# Altium footprint library 3D_MIG_Controller.PCBLIB: 560 footprints (part 22 of 35)
Each footprint in its own frame and in the unit in brackets; x right, y up, seen from the top. Pads: shape width x height; smd on the part's side, far side on the other; paste and mask are expansions set on the pad; w line width, h text height; cw(c..) or ccw(c..) is an arc to the next point about the centre after c.
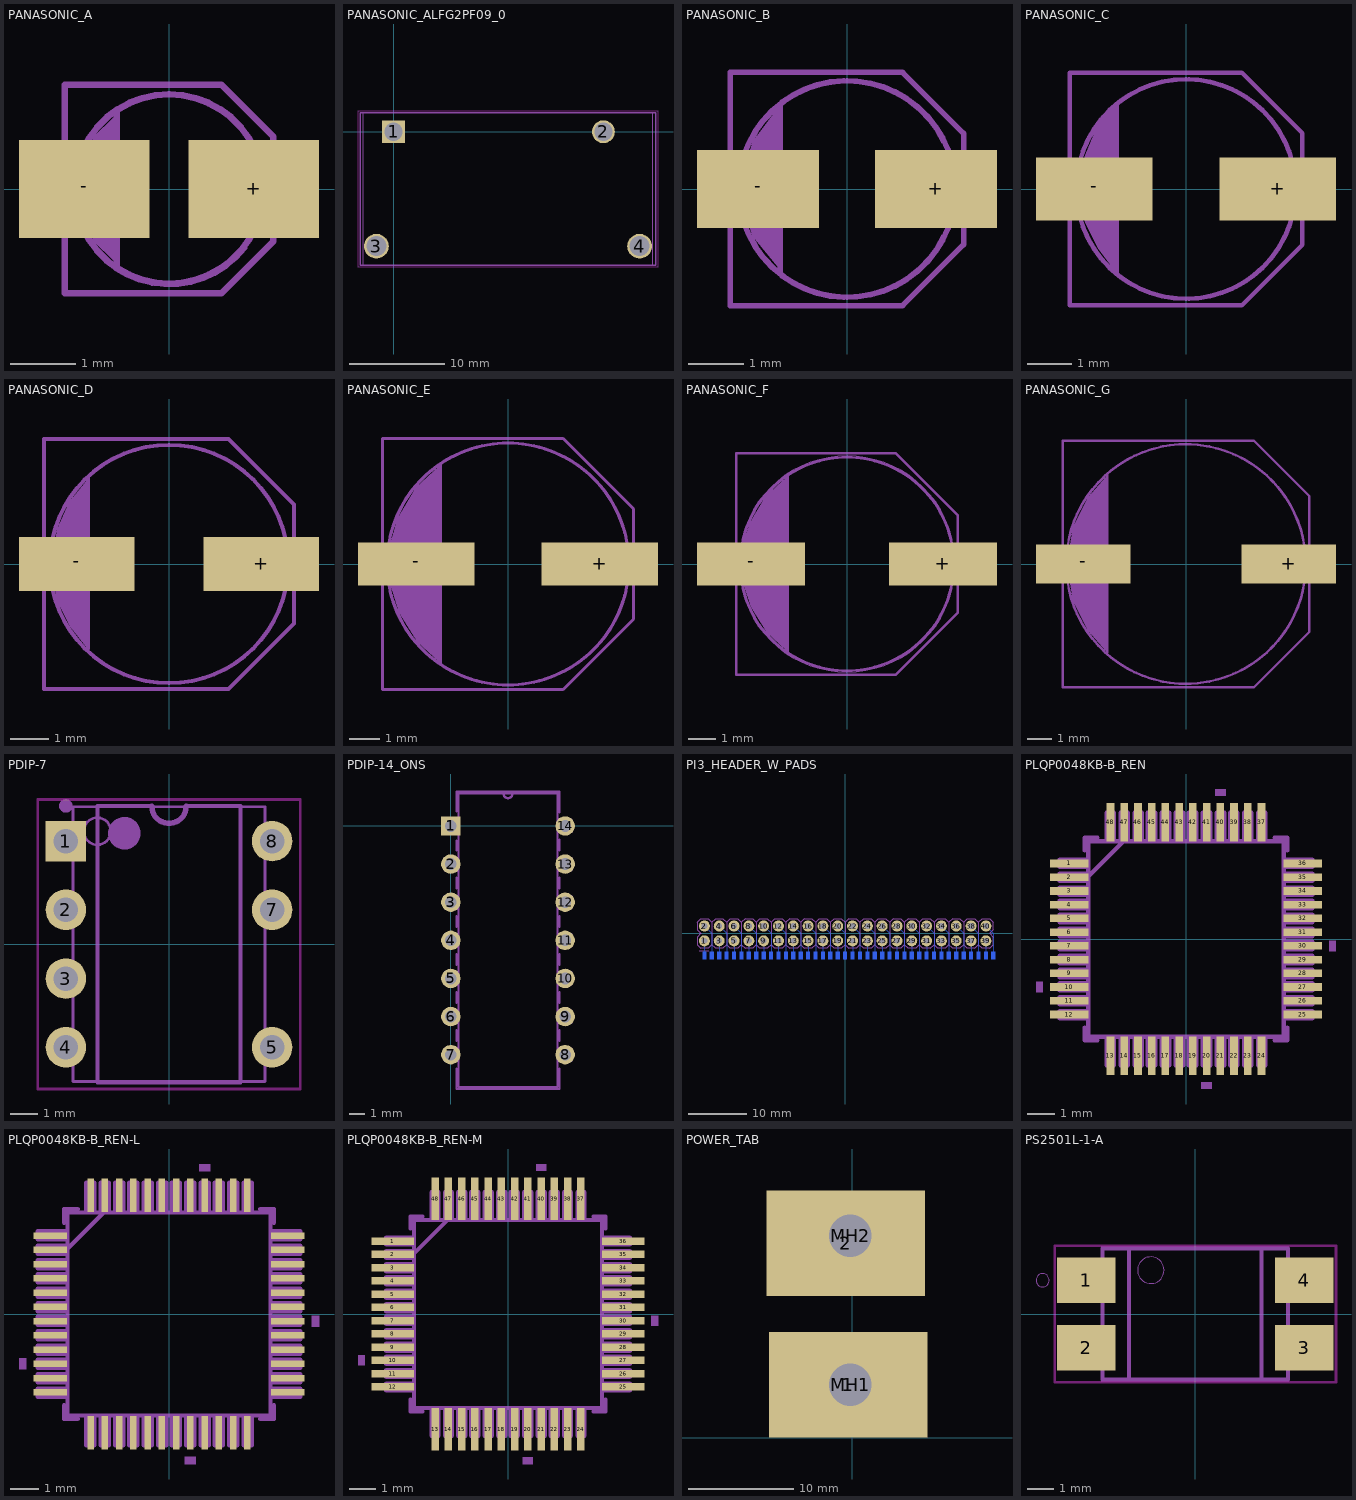
[diagram p21: the footprints below, top view; thin cyan lines are the x and y axes]

## PANASONIC_A [mm]
pads (2):
  rect 2x1.5 smd: +(1.3,0) -(-1.3,0)
tDocu:
  circle w0.102: c0,0 r1.45
  region: -1.8,-0.3 -1.8,0.3 -1.45,0.3 -1.45,-0.3
  region: 1.45,-0.3 1.45,0.3 1.8,0.3 1.8,-0.3
  region: -0.85,1.1 -1.15,0.8 -1.35,0.3 -1.35,-0.3 -1.15,-0.8 -0.85,-1.1 -0.85,1.05
  lines w0.102: -0.8,-1.2 -0.8,1.2 ; -1.6,-1.6 0.8,-1.6 1.6,-0.8 1.6,0.8 0.8,1.6 -1.6,1.6 -1.6,-1.6
tPlace:
  lines w0.102: -1.6,-0.95 -1.6,-1.6 0.8,-1.6 1.5,-0.9 ; -1.6,0.95 -1.6,1.6 0.8,1.6 1.5,0.9 ; -1.1,-0.95 ccw(c0.004,0) 1.15,-0.9 ; -1.1,0.95 cw(c0,0) 1.1,0.95

## PANASONIC_ALFG2PF09_0 [mil]
pads (4):
  rect 94.49x94.49 / inner round 87.3 / far side rect 94.49x94.49 hole 74.8: 1(0,0)
  round 94.49 hole 74.8: 2(866.14,0)
  round 102.36 hole 82.68: 3(-70.87,-472.44) 4(1015.75,-472.44)
Top keep-out:
  lines w3.94: -146.65,-560.04 -146.65,87.6 1091.54,87.6 1091.54,-560.04 -146.65,-560.04
tDocu:
  lines w3.94: -125.98,-551.18 1070.87,-551.18 1070.87,78.74 -125.98,78.74 -125.98,-551.18
tPlace:
  lines w5.91: -137.8,-551.18 -137.8,78.74 1082.68,78.74 1082.68,-551.18 -137.8,-551.18

## PANASONIC_B [mil]
pads (2):
  rect 86.61x55.12 smd: +(62.99,0) -(-62.99,0)
tDocu:
  circle w4: c0,0 r76.77
  region: -90.55,-13.78 -90.55,13.78 -72.83,13.78 -72.83,-13.78
  region: 74.8,-13.78 74.8,13.78 90.55,13.78 90.55,-13.78
  region: -49.21,57.09 -66.93,33.46 -72.83,13.78 -72.83,-15.75 -66.93,-33.46 -49.21,-55.12 -49.21,55.12
  lines w4: -47.24,-59.06 -47.24,59.06 ; -82.68,-82.68 39.37,-82.68 82.68,-39.37 82.68,39.37 39.37,82.68 -82.68,82.68 -82.68,-82.68
tPlace:
  lines w4: -82.68,-33.46 -82.68,-82.68 39.37,-82.68 82.68,-39.37 ; -82.68,33.46 -82.68,82.68 39.37,82.68 82.68,39.37 ; -68.9,-33.46 ccw(c0,0.01) 68.9,-33.46 ; -68.9,33.46 cw(c0,-0.01) 68.9,33.46

## PANASONIC_C [mil]
pads (2):
  rect 102.36x55.12 smd: +(80.71,0) -(-80.71,0)
tDocu:
  circle w4: c0,0 r96.46
  region: -116.14,-13.78 -116.14,13.78 -94.49,13.78 -94.49,-13.78
  region: 94.49,-13.78 94.49,13.78 116.14,13.78 116.14,-13.78
  region: -62.99,70.87 -78.74,53.15 -88.58,29.53 -96.46,1.97 -88.58,-29.53 -76.77,-53.15 -62.99,-70.87
  lines w4: -61.02,-72.83 -61.02,72.83 ; -102.36,-102.36 49.21,-102.36 102.36,-49.21 102.36,49.21 49.21,102.36 -102.36,102.36 -102.36,-102.36
tPlace:
  lines w4: -102.36,-37.4 -102.36,-102.36 49.21,-102.36 102.36,-49.21 102.36,-37.4 ; -102.36,37.4 -102.36,102.36 49.21,102.36 102.36,49.21 102.36,37.4 ; -90.55,-33.46 ccw(c0,0) 90.55,-33.46 ; -90.55,33.46 cw(c0,0) 90.55,33.46

## PANASONIC_D [mm]
pads (2):
  rect 3x1.4 smd: +(2.4,0) -(-2.4,0)
tDocu:
  circle w0.102: c0,0 r3.1
  region: -3.65,-0.35 -3.65,0.35 -3.05,0.35 -3.05,-0.35
  region: 3.05,-0.35 3.05,0.35 3.65,0.35 3.65,-0.35
  region: -2.15,2.15 -2.6,1.6 -2.9,0.9 -3.05,0 -2.9,-0.95 -2.55,-1.65 -2.15,-2.15 -2.15,2.1
  lines w0.102: -2.1,-2.2 -2.1,2.25 ; -3.25,-3.25 1.55,-3.25 3.25,-1.55 3.25,1.55 1.55,3.25 -3.25,3.25 -3.25,-3.25
tPlace:
  lines w0.102: -3.25,-0.95 -3.25,-3.25 1.55,-3.25 3.25,-1.55 3.25,-0.95 ; -3.25,0.95 -3.25,3.25 1.55,3.25 3.25,1.55 3.25,0.95 ; -2.95,-0.95 ccw(c0,0) 2.95,-0.95 ; -2.95,0.95 cw(c0,0) 2.95,0.95

## PANASONIC_E [mm]
pads (2):
  rect 3.8x1.4 smd: +(3,0) -(-3,0)
tDocu:
  circle w0.102: c0,0 r3.95
  region: -4.5,-0.35 -4.5,0.35 -3.8,0.35 -3.8,-0.35
  region: 3.8,-0.35 3.8,0.35 4.5,0.35 4.5,-0.35
  region: -2.25,3.2 -3,2.5 -3.6,1.5 -3.85,0.65 -3.85,-0.65 -3.55,-1.6 -2.95,-2.55 -2.25,-3.2 -2.25,3.15
  lines w0.102: -2.2,-3.25 -2.2,3.25 ; -4.1,-4.1 1.8,-4.1 4.1,-1.8 4.1,1.8 1.8,4.1 -4.1,4.1 -4.1,-4.1
tPlace:
  lines w0.102: -4.1,-0.9 -4.1,-4.1 1.8,-4.1 4.1,-1.8 4.1,-0.9 ; -4.1,0.9 -4.1,4.1 1.8,4.1 4.1,1.8 4.1,0.9 ; -3.85,-0.9 ccw(c0,0) 3.85,-0.9 ; -3.85,0.9 cw(c0,0) 3.85,0.9

## PANASONIC_F [mm]
pads (2):
  rect 4x1.6 smd: +(3.55,0) -(-3.55,0)
tDocu:
  circle w0.001: c0,0 r4
  circle w0.102: c0,0 r3.95
  region: -4.85,-0.45 -4.85,0.45 -3.9,0.45 -3.9,-0.45
  region: 3.9,-0.45 3.9,0.45 4.85,0.45 4.85,-0.45
  region: -2.25,3.2 -3,2.5 -3.6,1.5 -3.85,0.65 -3.85,-0.65 -3.55,-1.6 -2.95,-2.55 -2.25,-3.2 -2.25,3.15
  lines w0.102: -2.2,-3.25 -2.2,3.25 ; -4.1,-4.1 1.8,-4.1 4.1,-1.8 4.1,1.8 1.8,4.1 -4.1,4.1 -4.1,-4.1
tPlace:
  lines w0.102: -4.1,-1 -4.1,-4.1 1.8,-4.1 4.1,-1.8 4.1,-1 ; -4.1,1 -4.1,4.1 1.8,4.1 4.1,1.8 4.1,1 ; -3.85,-0.9 ccw(c0,0) 3.85,-0.9 ; -3.85,0.9 cw(c0,0) 3.85,0.9

## PANASONIC_G [mil]
pads (2):
  rect 153.54x62.99 smd: +(167.32,0) -(-167.32,0)
tDocu:
  circle w4: c0,0 r194.88
  region: -230.32,-17.72 -230.32,17.72 -192.91,17.72 -192.91,-17.72
  region: 192.91,-17.72 192.91,17.72 230.32,17.72 230.32,-17.72
  region: -129.92,141.73 -159.45,108.27 -183.07,61.02 -190.94,17.72 -190.94,-17.72 -183.07,-61.02 -159.45,-108.27 -129.92,-141.73 -129.92,139.76
  lines w4: -127.95,-143.7 -127.95,145.67 ; -200.79,-200.79 110.24,-200.79 200.79,-110.24 200.79,110.24 110.24,200.79 -200.79,200.79 -200.79,-200.79
tPlace:
  lines w4: -200.79,-39.37 -200.79,-200.79 110.24,-200.79 200.79,-110.24 200.79,-39.37 ; -200.79,39.37 -200.79,200.79 110.24,200.79 200.79,110.24 200.79,39.37 ; -190.94,-39.37 ccw(c0,0) 190.94,-39.37 ; -190.94,39.37 cw(c0,0) 190.94,39.37

## PDIP-7 [mil]
pads (7):
  rect 59.06x59.06 / inner round 54.56 / far side rect 59.06x59.06 hole 35.43: 1(-150,150)
  round 59.06 hole 35.43: 2(-150,50) 3(-150,-50) 4(-150,-150) 5(150,-150) 7(150,50) 8(150,150)
Top keep-out:
  lines w3.94: -190.94,-210.63 -190.94,210.63 190.94,210.63 190.94,-210.63 -190.94,-210.63
tDocu:
  circle w3.94: c-104.33,164.37 r19.69
  lines w3.94: -139.76,-199.8 -139.76,199.8 139.76,199.8 139.76,-199.8 -139.76,-199.8
tPlace:
  circle w9.84: c-150,201.18 r4.92
  circle w23.62: c-64.96,161.42 r11.81
  lines w5.91: -25,200.79 -104.33,200.79 -104.33,-200.79 104.33,-200.79 104.33,200.79 25,200.79
  lines w7.87: -25,200.79 ccw(c0,200.79) 25,200.79

## PDIP-14_ONS [mil]
pads (14):
  rect 51x51 / inner round 47.12 / far side rect 51x51 hole 31: 1(0,0)
  round 51 hole 31: 2(0,-100) 3(0,-200) 4(0,-300) 5(0,-400) 6(0,-500) 7(0,-600) 8(300,-600) 9(300,-500) 10(300,-400) 11(300,-300) 12(300,-200) 13(300,-100) 14(300,0)
tDocu:
  lines w6: 138,85 162,85 ; 138,85 20,85 20,-685 280,-685 280,85 162,85 ; 138,85 ccw(c150,85) 162,85 ; -16,-184 20,-184 20,-216 -15,-216 -16,-184 ; -16,-85 20,-84 20,-116 -15,-116 -16,-85 ; -16,15 20,16 20,-16 -15,-16 -16,15 ; -15,-616 -15,-584 20,-584 20,-616 -15,-616 ; -15,-516 -15,-484 20,-484 20,-516 -15,-516 ; -15,-416 -15,-384 20,-384 20,-416 -15,-416 ; -15,-316 -15,-284 20,-284 20,-316 -15,-316 ; 280,-616 280,-584 316,-584 316,-616 280,-616 ; 280,-516 280,-484 316,-484 316,-516 280,-516 ; 280,-416 280,-384 316,-384 316,-416 280,-416 ; 280,-316 280,-284 316,-284 316,-316 280,-316 ; 280,-216 280,-184 316,-184 316,-216 280,-216 ; 280,-116 280,-84 316,-84 316,-116 280,-116 ; 280,-16 280,16 316,16 316,-15 280,-16
  text "*" at 7,-25 h77.5
tPlace:
  lines w6: 15,-636 15,-690 285,-690 285,-636 ; 15,-564 15,-536 ; 15,-464 15,-436 ; 15,-364 15,-336 ; 15,-264 15,-236 ; 15,-164 15,-136 ; 15,-64 15,-39 ; 15,39 15,90 285,90 285,36 ; 285,-564 285,-536 ; 285,-464 285,-436 ; 285,-364 285,-336 ; 285,-264 285,-236 ; 285,-164 285,-136 ; 285,-64 285,-36
  text "*" at -23,30 h77.5

## PI3_HEADER_W_PADS [mil]
pads (80):
  round 74 hole 39.37: 1(-950,-50) 2(-950,50) 3(-850,-50) 4(-850,50) 5(-750,-50) 6(-750,50) 7(-650,-50) 8(-650,50) 9(-550,-50) 10(-550,50) 11(-450,-50) 12(-450,50) 13(-350,-50) 14(-350,50) 15(-250,-50) 16(-250,50) 17(-150,-50) 18(-150,50) 19(-50,-50) 20(-50,50) 21(50,-50) 22(50,50) 23(150,-50) 24(150,50) 25(250,-50) 26(250,50) 27(350,-50) 28(350,50) 29(450,-50) 30(450,50) 31(550,-50) 32(550,50) 33(650,-50) 34(650,50) 35(750,-50) 36(750,50) 37(850,-50) 38(850,50) 39(950,-50) 40(950,50)
  rect 25x50 smd far side: P$1(-950,-150) P$2(-900,-150) P$3(-850,-150) P$4(-800,-150) P$5(-750,-150) P$6(-700,-150) P$7(-650,-150) P$8(-600,-150) P$9(-550,-150) P$10(-500,-150) P$11(-450,-150) P$12(-400,-150) P$13(-350,-150) P$14(-300,-150) P$15(-250,-150) P$16(-200,-150) P$17(-150,-150) P$18(-100,-150) P$19(-50,-150) P$20(0,-150) P$21(50,-150) P$22(100,-150) P$23(150,-150) P$24(200,-150) P$25(250,-150) P$26(300,-150) P$27(350,-150) P$28(400,-150) P$29(450,-150) P$30(500,-150) P$31(550,-150) P$32(600,-150) P$33(650,-150) P$34(700,-150) P$35(750,-150) P$36(800,-150) P$37(850,-150) P$38(900,-150) P$39(950,-150) P$40(1000,-150)
Bottom:
  lines w7.87: -950,-150 -950,-50 ; -950,50 -900,0 -900,-150 ; -850,-150 -850,-50 ; -850,50 -800,0 -800,-150 ; -750,-150 -750,-50 ; -750,50 -700,0 -700,-150 ; -650,-150 -650,-50 ; -650,50 -600,0 -600,-150 ; -550,-150 -550,-50 ; -550,50 -500,0 -500,-150 ; -450,-150 -450,-50 ; -450,50 -400,0 -400,-150 ; -350,-150 -350,-50 ; -350,50 -300,0 -300,-150 ; -250,-150 -250,-50 ; -250,50 -200,0 -200,-150 ; -150,-150 -150,-50 ; -150,50 -100,0 -100,-150 ; -50,-150 -50,-50 ; -50,50 0,0 0,-150 ; 50,-150 50,-50 ; 50,50 100,0 100,-150 ; 150,-150 150,-50 ; 150,50 200,0 200,-150 ; 250,-150 250,-50 ; 250,50 300,0 300,-150 ; 350,-150 350,-50 ; 350,50 400,0 400,-150 ; 450,-150 450,-50 ; 450,50 500,0 500,-150 ; 550,-150 550,-50 ; 550,50 600,0 600,-150 ; 650,-150 650,-50 ; 650,50 700,0 700,-150 ; 750,-150 750,-50 ; 750,50 800,0 800,-150 ; 850,-150 850,-50 ; 850,50 900,0 900,-150 ; 950,-150 950,-50 ; 950,50 1000,0 1000,-150
tDocu:
  drawing of 40 lines, arcs and shapes, not listed
tPlace:
  lines w8: -984.88,-115.37 -919.88,-115.37 ; -899.88,-75.37 -924.88,-100.37 -974.88,-100.37 -999.88,-75.37 -999.88,-25.37 -974.88,-0.37 -999.88,24.63 -999.88,74.63 -974.88,99.63 -924.88,99.63 -899.88,74.63 ; -899.88,-75.37 -874.88,-100.37 -824.88,-100.37 -799.88,-75.37 ; -899.88,-75.37 -899.88,74.63 ; -899.88,74.63 -874.88,99.63 -824.88,99.63 -799.88,74.63 ; -799.88,-75.37 -774.88,-100.37 -724.88,-100.37 -699.88,-75.37 ; -799.88,-75.37 -799.88,74.63 ; -799.88,74.63 -774.88,99.63 -724.88,99.63 -699.88,74.63 ; -699.88,-75.37 -674.88,-100.37 -624.88,-100.37 -599.88,-75.37 ; -699.88,-75.37 -699.88,74.63 ; -699.88,74.63 -674.88,99.63 -624.88,99.63 -599.88,74.63 ; -599.88,-75.37 -574.88,-100.37 -524.88,-100.37 -499.88,-75.37 ; -599.88,-75.37 -599.88,74.63 ; -599.88,74.63 -574.88,99.63 -524.88,99.63 -499.88,74.63 ; -499.88,-75.37 -474.88,-100.37 -424.88,-100.37 -399.88,-75.37 ; -499.88,-75.37 -499.88,74.63 ; -499.88,74.63 -474.88,99.63 -424.88,99.63 -399.88,74.63 ; -399.88,-75.37 -374.88,-100.37 -324.88,-100.37 -299.88,-75.37 ; -399.88,-75.37 -399.88,74.63 ; -399.88,74.63 -374.88,99.63 -324.88,99.63 -299.88,74.63 ; -299.88,-75.37 -274.88,-100.37 -224.88,-100.37 -199.88,-75.37 ; -299.88,-75.37 -299.88,74.63 ; -299.88,74.63 -274.88,99.63 -224.88,99.63 -199.88,74.63 ; -199.88,-75.37 -174.88,-100.37 -124.88,-100.37 -99.88,-75.37 ; -199.88,-75.37 -199.88,74.63 ; -199.88,74.63 -174.88,99.63 -124.88,99.63 -99.88,74.63 ; -99.88,-75.37 -74.88,-100.37 -24.88,-100.37 0.12,-75.37 ; -99.88,-75.37 -99.88,74.63 ; -99.88,74.63 -74.88,99.63 -24.88,99.63 0.12,74.63 ; 0.12,-75.37 25.12,-100.37 75.12,-100.37 100.12,-75.37 ; 0.12,-75.37 0.12,74.63 ; 0.12,74.63 25.12,99.63 75.12,99.63 100.12,74.63 ; 100.12,-75.37 125.12,-100.37 175.12,-100.37 200.12,-75.37 ; 100.12,-75.37 100.12,74.63 ; 100.12,74.63 125.12,99.63 175.12,99.63 200.12,74.63 ; 200.12,-75.37 225.12,-100.37 275.12,-100.37 300.12,-75.37 ; 200.12,-75.37 200.12,74.63 ; 200.12,74.63 225.12,99.63 275.12,99.63 300.12,74.63 ; 300.12,-75.37 300.12,74.63 ; 300.12,-75.37 325.12,-100.37 375.12,-100.37 400.12,-75.37 ; 300.12,74.63 325.12,99.63 375.12,99.63 400.12,74.63 ; 400.12,-75.37 400.12,74.63 ; 400.12,-75.37 425.12,-100.37 475.12,-100.37 500.12,-75.37 ; 400.12,74.63 425.12,99.63 475.12,99.63 500.12,74.63 ; 500.12,-75.37 500.12,74.63 ; 500.12,-75.37 525.12,-100.37 575.12,-100.37 600.12,-75.37 ; 500.12,74.63 525.12,99.63 575.12,99.63 600.12,74.63 ; 600.12,-75.37 600.12,74.63 ; 600.12,-75.37 625.12,-100.37 675.12,-100.37 700.12,-75.37 ; 600.12,74.63 625.12,99.63 675.12,99.63 700.12,74.63 ; 700.12,-75.37 700.12,74.63 ; 700.12,-75.37 725.12,-100.37 775.12,-100.37 800.12,-75.37 ; 700.12,74.63 725.12,99.63 775.12,99.63 800.12,74.63 ; 800.12,-75.37 800.12,74.63 ; 800.12,-75.37 825.12,-100.37 875.12,-100.37 900.12,-75.37 ; 800.12,74.63 825.12,99.63 875.12,99.63 900.12,74.63 ; 900.12,-75.37 900.12,74.63 ; 900.12,-75.37 925.12,-100.37 975.12,-100.37 1000.12,-75.37 1000.12,-25.37 975.12,-0.37 1000.12,24.63 1000.12,74.63 975.12,99.63 925.12,99.63 900.12,74.63
bPlace:
  lines w8: -984.88,-115.37 -919.88,-115.37

## PLQP0048KB-B_REN [mil]
pads (48):
  rect 55x11 smd: 1(-167.5,108.27) 2(-167.5,88.58) 3(-167.5,68.9) 4(-167.5,49.21) 5(-167.5,29.53) 6(-167.5,9.84) 7(-167.5,-9.84) 8(-167.5,-29.53) 9(-167.5,-49.21) 10(-167.5,-68.9) 11(-167.5,-88.58) 12(-167.5,-108.27) 25(167.5,-108.27) 26(167.5,-88.58) 27(167.5,-68.9) 28(167.5,-49.21) 29(167.5,-29.53) 30(167.5,-9.84) 31(167.5,9.84) 32(167.5,29.53) 33(167.5,49.21) 34(167.5,68.9) 35(167.5,88.58) 36(167.5,108.27)
  rect 11x55 smd: 13(-108.27,-167.5) 14(-88.58,-167.5) 15(-68.9,-167.5) 16(-49.21,-167.5) 17(-29.53,-167.5) 18(-9.84,-167.5) 19(9.84,-167.5) 20(29.53,-167.5) 21(49.21,-167.5) 22(68.9,-167.5) 23(88.58,-167.5) 24(108.27,-167.5) 37(108.27,167.5) 38(88.58,167.5) 39(68.9,167.5) 40(49.21,167.5) 41(29.53,167.5) 42(9.84,167.5) 43(-9.84,167.5) 44(-29.53,167.5) 45(-49.21,167.5) 46(-68.9,167.5) 47(-88.58,167.5) 48(-108.27,167.5)
tDocu:
  drawing of 199 lines, arcs and shapes, not listed
  text "*" at -148,93 h77.5
tPlace:
  region: -215,-61.4 -215,-76.4 -205,-76.4 -205,-61.4
  region: 22.03,-205 22.03,-215 37.03,-215 37.03,-205
  region: 215,-2.34 215,-17.34 205,-17.34 205,-2.34
  region: 41.71,205 41.71,215 56.71,215 56.71,205
  lines w6: -145,-127 -145,-145 -127,-145 ; -145,127 -145,145 -127,145 ; 127,-145 145,-145 145,-127 ; 127,145 145,145 145,127
  text "*" at -243,108 h77.5

## PLQP0048KB-B_REN-L [mil]
pads (48):
  rect 46x9 smd: 1(-164,108.27) 2(-164,88.58) 3(-164,68.9) 4(-164,49.21) 5(-164,29.53) 6(-164,9.84) 7(-164,-9.84) 8(-164,-29.53) 9(-164,-49.21) 10(-164,-68.9) 11(-164,-88.58) 12(-164,-108.27) 25(164,-108.27) 26(164,-88.58) 27(164,-68.9) 28(164,-49.21) 29(164,-29.53) 30(164,-9.84) 31(164,9.84) 32(164,29.53) 33(164,49.21) 34(164,68.9) 35(164,88.58) 36(164,108.27)
  rect 9x46 smd: 13(-108.27,-164) 14(-88.58,-164) 15(-68.9,-164) 16(-49.21,-164) 17(-29.53,-164) 18(-9.84,-164) 19(9.84,-164) 20(29.53,-164) 21(49.21,-164) 22(68.9,-164) 23(88.58,-164) 24(108.27,-164) 37(108.27,164) 38(88.58,164) 39(68.9,164) 40(49.21,164) 41(29.53,164) 42(9.84,164) 43(-9.84,164) 44(-29.53,164) 45(-49.21,164) 46(-68.9,164) 47(-88.58,164) 48(-108.27,164)
tDocu:
  drawing of 199 lines, arcs and shapes, not listed
  text "*" at -148,93 h77.5
tPlace:
  region: -207,-61.4 -207,-76.4 -197,-76.4 -197,-61.4
  region: 22.03,-197 22.03,-207 37.03,-207 37.03,-197
  region: 207,-2.34 207,-17.34 197,-17.34 197,-2.34
  region: 41.71,197 41.71,207 56.71,207 56.71,197
  lines w6: -145,-126 -145,-145 -126,-145 ; -145,126 -145,145 -126,145 ; 126,-145 145,-145 145,-126 ; 126,145 145,145 145,126
  text "*" at -235,108 h77.5

## PLQP0048KB-B_REN-M [mil]
pads (48):
  rect 63x11 smd: 1(-171.5,108.27) 2(-171.5,88.58) 3(-171.5,68.9) 4(-171.5,49.21) 5(-171.5,29.53) 6(-171.5,9.84) 7(-171.5,-9.84) 8(-171.5,-29.53) 9(-171.5,-49.21) 10(-171.5,-68.9) 11(-171.5,-88.58) 12(-171.5,-108.27) 25(171.5,-108.27) 26(171.5,-88.58) 27(171.5,-68.9) 28(171.5,-49.21) 29(171.5,-29.53) 30(171.5,-9.84) 31(171.5,9.84) 32(171.5,29.53) 33(171.5,49.21) 34(171.5,68.9) 35(171.5,88.58) 36(171.5,108.27)
  rect 11x63 smd: 13(-108.27,-171.5) 14(-88.58,-171.5) 15(-68.9,-171.5) 16(-49.21,-171.5) 17(-29.53,-171.5) 18(-9.84,-171.5) 19(9.84,-171.5) 20(29.53,-171.5) 21(49.21,-171.5) 22(68.9,-171.5) 23(88.58,-171.5) 24(108.27,-171.5) 37(108.27,171.5) 38(88.58,171.5) 39(68.9,171.5) 40(49.21,171.5) 41(29.53,171.5) 42(9.84,171.5) 43(-9.84,171.5) 44(-29.53,171.5) 45(-49.21,171.5) 46(-68.9,171.5) 47(-88.58,171.5) 48(-108.27,171.5)
tDocu:
  drawing of 199 lines, arcs and shapes, not listed
  text "*" at -148,93 h77.5
tPlace:
  region: -223,-61.4 -223,-76.4 -213,-76.4 -213,-61.4
  region: 22.03,-213 22.03,-223 37.03,-223 37.03,-213
  region: 223,-2.34 223,-17.34 213,-17.34 213,-2.34
  region: 41.71,213 41.71,223 56.71,223 56.71,213
  lines w6: -145,-127 -145,-145 -127,-145 ; -145,127 -145,145 -127,145 ; 127,-145 145,-145 145,-127 ; 127,145 145,145 145,127
  text "*" at -251,108 h77.5

## POWER_TAB [mm]
pads (4):
  rect 15x10 smd: 1(-0.4,5) 2(-0.6,18.4)
  round 4 hole 4 unplated: MH1(-0.2,5) MH2(-0.2,19.1)

## PS2501L-1-A [mil]
pads (4):
  rect 86.61x66.93 smd: 1(-161.42,50) 2(-161.42,-50) 3(161.42,-50) 4(161.42,50)
Top keep-out:
  lines w3.94: -208.66,-101.38 -208.66,101.38 208.66,101.38 208.66,-101.38 -208.66,-101.38
tDocu:
  lines w5.91: -137.8,-97.44 -137.8,97.44 137.8,97.44 137.8,-97.44 -137.8,-97.44
tPlace:
  circle w0: c-226.38,50 r9.84
  circle w0: c-65.94,64.96 r19.69
  lines w5.91: -98.43,-97.44 -98.43,97.44 98.43,97.44 98.43,-97.44 -98.43,-97.44